# Altium footprint library Ixora.PcbLib: 199 footprints (part 8 of 13)
Each footprint in its own frame and in the unit in brackets; x right, y up, seen from the top. Pads: shape width x height; smd on the part's side, far side on the other; paste and mask are expansions set on the pad; w line width, h text height; cw(c..) or ccw(c..) is an arc to the next point about the centre after c.
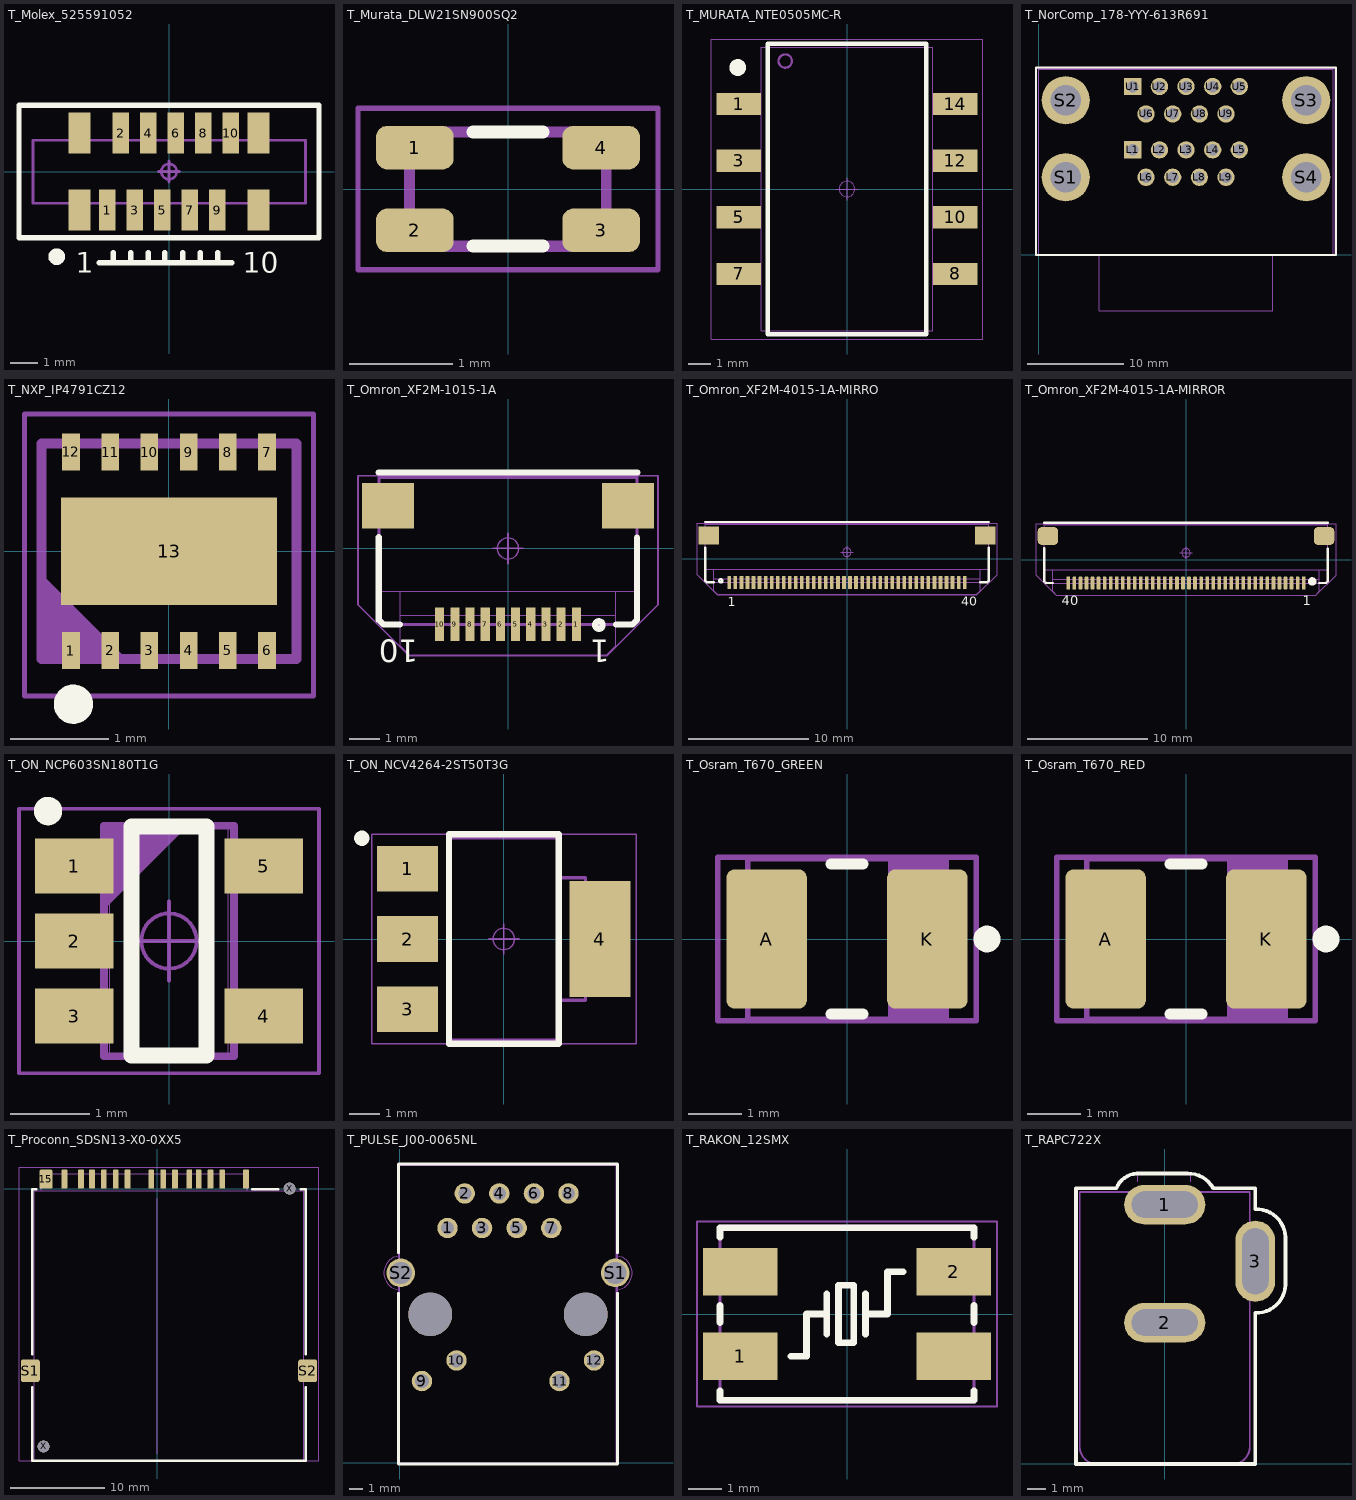
[diagram p7: the footprints below, top view; thin cyan lines are the x and y axes]

## T_Molex_525591052 [mm] "FFC, 10 pin, vertical,  1 sided contact,"
height 3.9
pads (14):
  rect 0.6x1.5 smd: 1(-2.25,-1.4) 2(-1.75,1.4) 3(-1.25,-1.4) 4(-0.75,1.4) 5(-0.25,-1.4) 6(0.25,1.4) 7(0.75,-1.4) 8(1.25,1.4) 9(1.75,-1.4) 10(2.25,1.4)
  rect 0.8x1.5 smd: ""(-3.25,-1.4) ""(-3.25,1.4) ""(3.25,-1.4) ""(3.25,1.4)
Top Overlay:
  circle w0.3: c-4.089,-3.099 r0.153
  lines w0.2: -2.54,-3.327 2.286,-3.327 ; -2.032,-3.327 -2.032,-2.946 ; -1.397,-3.327 -1.397,-2.946 ; -0.762,-3.327 -0.762,-2.946 ; -0.152,-3.327 -0.152,-2.946 ; 0.508,-3.327 0.508,-2.946 ; 1.143,-3.327 1.143,-2.946 ; 1.778,-3.327 1.778,-2.946 ; -5.461,-2.413 5.461,-2.413 5.461,2.413 -5.461,2.413 -5.461,-2.413
  text "1" at -3.404,-3.681 h0.75
  text "10" at 2.692,-3.681 h0.75
Mechanical 1:
  lines w0.1: -5.461,-2.413 5.461,-2.413 5.461,2.413 -5.461,2.413 -5.461,-2.413
Mechanical 2:
  lines w0.01: -4.95,-1.15 -4.95,1.15 4.95,1.15 4.95,-1.15 -4.95,-1.15
Mechanical 3:
  circle w0.1: c0,0 r0.279
  lines w0.1: -0.381,0 0.381,0 ; 0,-0.381 0,0.381 ; -4.95,-1.15 -4.95,1.143 4.978,1.143 4.978,-1.15 -4.95,-1.15
3D body "525591052.stp": height 5.3, standoff 0, extent -5.35,-1.65 5.35,1.85

## T_Murata_DLW21SN900SQ2 [mm] "Common Mode Choke"
height 1.2
pads (4):
  rrect50% 0.75x0.42 smd: 1(-0.9,0.4) 2(-0.9,-0.4) 3(0.9,-0.4) 4(0.9,0.4)
Top Overlay:
  lines w0.127: -0.34,-0.55 0.34,-0.55 ; -0.34,0.55 0.34,0.55
Mechanical 1:
  lines w0.05: -1.45,-0.78 -1.45,0.78 1.45,0.78 1.45,-0.78 -1.45,-0.78
Mechanical 2:
  lines w0.001: -1,-0.6 -1,0.6 1,0.6 1,-0.6 -1,-0.6
Mechanical 3:
  lines w0.1: -0.95,-0.55 -0.95,0.55 0.95,0.55 0.95,-0.55 -0.95,-0.55
3D body: height 1.2, standoff 0, extent -1,-0.6 1,0.6

## T_MURATA_NTE0505MC-R [mm] "Isolated DC/DC converter"
height 6.6
pads (8):
  rect 2x1 smd: 1(-4.85,3.81) 3(-4.85,1.27) 5(-4.85,-1.27) 7(-4.85,-3.81) 8(4.85,-3.81) 10(4.85,-1.27) 12(4.85,1.27) 14(4.85,3.81)
Top Overlay:
  circle w0.5: c-4.905,5.45 r0.125
  lines w0.2: -3.56,-6.51 -3.56,6.51 3.56,6.51 3.56,-6.51 -3.56,-6.51
Mechanical 1:
  circle w0.05: c0,0 r0.35
  lines w0.05: -0.5,0 0.5,0 ; 0,-0.5 0,0.5 ; -6.08,-6.73 -6.08,6.73 6.08,6.73 6.08,-6.73 -6.08,-6.73
Mechanical 2:
  lines w0.001: -3.85,-6.35 -3.85,6.35 3.85,6.35 3.85,-6.35 -3.85,-6.35
Mechanical 3:
  circle w0.1: c-2.77,5.74 r0.3
  lines w0.1: -3.56,-6.51 3.56,-6.51 3.56,6.51 -3.56,6.51 -3.56,-6.51
3D body: height 6.6, standoff 0, extent -3.85,-6.35 3.85,6.35

## T_NorComp_178-YYY-613R691 [mm] "0.750 Center Dual Port D-Sub - Male over Male"
height 31.75
pads (22):
  rect 1.8x1.8 hole 1.2: L1(9.754,10.922) U1(9.754,17.501)
  round 1.8 hole 1.2: L2(12.522,10.922) L3(15.291,10.922) L4(18.059,10.922) L5(20.828,10.922) L6(11.138,8.077) L7(13.906,8.077) L8(16.675,8.077) L9(19.444,8.077) U2(12.522,17.501) U3(15.291,17.501) U4(18.059,17.501) U5(20.828,17.501) U6(11.138,14.656) U7(13.906,14.656) U8(16.675,14.656) U9(19.444,14.656)
  round 5 hole 3.2: S1(2.794,8.077) S2(2.794,16.078) S3(27.788,16.078) S4(27.788,8.077)
Top Overlay:
  lines w0.2: -0.3,0 30.875,0 30.875,19.5 -0.3,19.5 -0.3,0
Mechanical 1:
  lines w0.05: -0.213,0 30.802,0 30.802,19.417 -0.213,19.417 -0.213,0
Mechanical 2:
  lines w0.001: -0.002,0 30.58,0 ; 0,0 0,19.31 30.582,19.31 30.582,0 ; 6.291,0 6.291,-5.791 24.291,-5.791 24.291,0
Mechanical 3:
  lines w0.1: -0.216,0 30.802,0 30.802,19.413 -0.216,19.413 -0.216,0
3D body "178-009-613.STEP": height 31.79, standoff -3.16, extent -0.114,-6.096 30.696,19.304

## T_NXP_IP4791CZ12 [mm] "HDMI ESD protection, level shifter and backdrive protection- SOT1156-1"
height 0.5
pads (13):
  rect 0.18x0.375 smd: 1(-1,-1.012) 2(-0.6,-1.012) 3(-0.2,-1.012) 4(0.2,-1.012) 5(0.6,-1.012) 6(1,-1.012) 7(1,1.012) 8(0.6,1.012) 9(0.2,1.012) 10(-0.2,1.012) 11(-0.6,1.012) 12(-1,1.012)
  rect 2.2x1.1 smd paste-2: 13(0,0)
Top Overlay:
  circle w0.2: c-0.975,-1.56 r0.1
Top Paste:
  rectangle: -0.4,-0.2 0.4,0.2
Mechanical 1:
  circle w0.05: c0,0 r0.35
  lines w0.05: -0.5,0 0.5,0 ; 0,-0.5 0,0.5 ; -1.475,-1.475 1.475,-1.475 1.475,1.4 -1.475,1.4 -1.475,-1.475
Mechanical 2:
  lines w0.01: -1.3,-1.1 -1.3,1.1 1.3,1.1 1.3,-1.1 -1.3,-1.1
Mechanical 3:
  lines w0.1: -1.3,-1 -1.2,-1.1 ; -1.3,-0.9 -1.1,-1.1 ; -1.3,-0.8 -1,-1.1 ; -1.3,-0.7 -0.9,-1.1 ; -1.3,-0.6 -0.8,-1.1 ; -1.3,-0.5 -0.7,-1.1 ; -1.3,-0.4 -0.6,-1.1 ; -1.3,-0.3 -0.5,-1.1 ; -1.3,-1.1 -1.3,1.1 1.3,1.1 1.3,-1.1 -1.3,-1.1
3D body: height 0.5, standoff 0, extent -1.3,-1.1 1.3,1.1

## T_Omron_XF2M-1015-1A [mm] "FFC Connector, Rotart Lock, Top Bottom Contact 0.5mm pitch"
height 2
pads (12):
  rect 0.3x1.1 smd: 1(2.25,-2.5) 2(1.75,-2.5) 3(1.25,-2.5) 4(0.75,-2.5) 5(0.25,-2.5) 6(-0.25,-2.5) 7(-0.75,-2.5) 8(-1.25,-2.5) 9(-1.75,-2.5) 10(-2.25,-2.5)
  rect 1.7x1.5 smd: ""(-3.95,1.4) ""(3.95,1.4)
Top Overlay:
  circle w0.2: c2.991,-2.519 r0.125
  lines w0.2: -4.252,0.369 -4.252,-2.348 -4.1,-2.5 -3.55,-2.5 ; -4.252,2.507 4.252,2.507 ; 3.55,-2.5 4.1,-2.5 4.25,-2.35 4.25,0.367
  text "1" at 3.35,-3 h0.75
  text "10" at -2.95,-3 h0.75
Mechanical 1:
  circle w0.05: c0,0 r0.35
  lines w0.05: -0.5,0 0.5,0 ; 0,-0.5 0,0.5 ; -4.936,-1.853 -3.261,-3.528 3.262,-3.528 4.936,-1.854 4.936,2.4 -4.936,2.4 -4.936,-1.853
Mechanical 2:
  lines w0.001: -4.25,-1.4 4.25,-1.4 ; -3.55,-2.5 -4.1,-2.5 -4.25,-2.35 -4.25,0.9 -4.55,0.9 -4.55,2 -4.25,2 -4.25,2.4 4.25,2.4 4.25,2 4.55,2 4.55,0.9 4.25,0.9 4.25,-2.35 4.1,-2.5 3.55,-2.5 ; -3.55,-2.2 3.55,-2.2 ; -3.55,-1.4 -3.55,-3.2 -3.25,-3.5 ; -3.2,-3.5 3.3,-3.5 ; 3.25,-3.5 3.55,-3.2 3.55,-1.4
Mechanical 3:
  lines w0.1: 4.25,2.334 4.25,-2.35 4.1,-2.5 -4.1,-2.5 -4.252,-2.348 -4.252,2.334 4.252,2.334
3D body "XF2M_1015_1A.step": height 2, standoff 0, extent -4.55,-3.5 4.55,2.4

## T_Omron_XF2M-4015-1A-MIRRO [mm] "DVI FFC Connector 0.5mm pitch"
height 2
pads (42):
  rect 0.3x1.1 smd: 1(-9.75,-1.95) 2(-9.25,-1.95) 3(-8.75,-1.95) 4(-8.25,-1.95) 5(-7.75,-1.95) 6(-7.25,-1.95) 7(-6.75,-1.95) 8(-6.25,-1.95) 9(-5.75,-1.95) 10(-5.25,-1.95) 11(-4.75,-1.95) 12(-4.25,-1.95) 13(-3.75,-1.95) 14(-3.25,-1.95) 15(-2.75,-1.95) 16(-2.25,-1.95) 17(-1.75,-1.95) 18(-1.25,-1.95) 19(-0.75,-1.95) 20(-0.25,-1.95) 21(0.25,-1.95) 22(0.75,-1.95) 23(1.25,-1.95) 24(1.75,-1.95) 25(2.25,-1.95) 26(2.75,-1.95) 27(3.25,-1.95) 28(3.75,-1.95) 29(4.25,-1.95) 30(4.75,-1.95) 31(5.25,-1.95) 32(5.75,-1.95) 33(6.25,-1.95) 34(6.75,-1.95) 35(7.25,-1.95) 36(7.75,-1.95) 37(8.25,-1.95) 38(8.75,-1.95) 39(9.25,-1.95) 40(9.75,-1.95)
  rect 1.7x1.5 smd: ""(-11.45,1.95) ""(11.45,1.95)
Top Overlay:
  circle w0.2: c-10.459,-1.819 r0.125
  lines w0.2: -11.752,0.919 -11.752,-1.798 -11.6,-1.95 -11.05,-1.95 ; -11.752,3.057 11.75,3.057 ; 11.05,-1.95 11.6,-1.95 11.75,-1.8 11.75,0.917
  text "1" at -9.885,-3.908 h0.75
  text "40" at 9.46,-3.899 h0.75
Mechanical 1:
  circle w0.05: c0,0.55 r0.35
  lines w0.05: -0.5,0.55 0.5,0.55 ; 0,0.05 0,1.05 ; -12.436,-1.303 -12.436,2.95 12.436,2.95 12.436,-1.304 10.762,-2.978 -10.761,-2.978 -12.436,-1.303
Mechanical 2:
  lines w0.001: -11.75,-0.85 11.75,-0.85 ; -11.05,-1.95 -11.6,-1.95 -11.75,-1.8 -11.75,1.45 -12.05,1.45 -12.05,2.55 -11.75,2.55 -11.75,2.95 11.75,2.95 11.75,2.55 12.05,2.55 12.05,1.45 11.75,1.45 11.75,-1.8 11.6,-1.95 11.05,-1.95 ; -11.05,-1.65 11.05,-1.65 ; -11.05,-0.85 -11.05,-2.65 -10.75,-2.95 10.75,-2.95 11.05,-2.65 11.05,-0.85
Mechanical 3:
  lines w0.1: -11.752,-1.798 -11.752,2.884 11.75,2.884 11.75,-1.8 11.6,-1.95 -11.6,-1.95 -11.752,-1.798
3D body "xf2m-4015-1a.stp": height 2.02, standoff 0.02, extent -12.05,-2.95 12.05,2.95

## T_Omron_XF2M-4015-1A-MIRROR [mm] "DVI FFC Connector 0.5mm pitch"
height 2
pads (42):
  rrect50% 0.3x1.1 smd: 1(9.75,-1.95) 2(9.25,-1.95) 3(8.75,-1.95) 4(8.25,-1.95) 5(7.75,-1.95) 6(7.25,-1.95) 7(6.75,-1.95) 8(6.25,-1.95) 9(5.75,-1.95) 10(5.25,-1.95) 11(4.75,-1.95) 12(4.25,-1.95) 13(3.75,-1.95) 14(3.25,-1.95) 15(2.75,-1.95) 16(2.25,-1.95) 17(1.75,-1.95) 18(1.25,-1.95) 19(0.75,-1.95) 20(0.25,-1.95) 21(-0.25,-1.95) 22(-0.75,-1.95) 23(-1.25,-1.95) 24(-1.75,-1.95) 25(-2.25,-1.95) 26(-2.75,-1.95) 27(-3.25,-1.95) 28(-3.75,-1.95) 29(-4.25,-1.95) 30(-4.75,-1.95) 31(-5.25,-1.95) 32(-5.75,-1.95) 33(-6.25,-1.95) 34(-6.75,-1.95) 35(-7.25,-1.95) 36(-7.75,-1.95) 37(-8.25,-1.95) 38(-8.75,-1.95) 39(-9.25,-1.95) 40(-9.75,-1.95)
  rrect50% 1.7x1.5 smd: ""(-11.45,1.95) ""(11.45,1.95)
Top Overlay:
  circle w0.5: c10.459,-1.819 r0.1
  lines w0.2: -11.752,0.919 -11.752,-1.798 -11.6,-1.95 -11.05,-1.95 ; -11.752,3.057 11.75,3.057 ; 11.05,-1.95 11.6,-1.95 11.75,-1.8 11.75,0.917
  text "1" at 9.7,-3.8 h0.8
  text "40" at -10.3,-3.8 h0.8
Mechanical 1:
  circle w0.05: c0,0.55 r0.35
  lines w0.05: -0.5,0.55 0.5,0.55 ; 0,0.05 0,1.05 ; -12.436,-1.303 -12.436,2.95 12.436,2.95 12.436,-1.304 10.762,-2.978 -10.761,-2.978 -12.436,-1.303
Mechanical 2:
  lines w0.001: -11.75,-0.85 11.75,-0.85 ; -11.05,-1.95 -11.6,-1.95 -11.75,-1.8 -11.75,1.45 -12.05,1.45 -12.05,2.55 -11.75,2.55 -11.75,2.95 11.75,2.95 11.75,2.55 12.05,2.55 12.05,1.45 11.75,1.45 11.75,-1.8 11.6,-1.95 11.05,-1.95 ; -11.05,-1.65 11.05,-1.65 ; -11.05,-0.85 -11.05,-2.65 -10.75,-2.95 10.75,-2.95 11.05,-2.65 11.05,-0.85
Mechanical 3:
  lines w0.1: -11.752,-1.798 -11.752,2.884 11.75,2.884 11.75,-1.8 11.6,-1.95 -11.6,-1.95 -11.752,-1.798
3D body "xf2m-4015-1a.stp": height 2.02, standoff 0.02, extent -12.05,-2.95 12.05,2.95

## T_ON_NCP603SN180T1G [mm] "SOT 23"
height 1.1
pads (5):
  rect 1x0.7 smd: 1(-1.2,0.95) 2(-1.2,0) 3(-1.2,-0.95) 4(1.2,-0.95) 5(1.2,0.95)
Top Overlay:
  circle w0.2: c-1.533,1.646 r0.08
  lines w0.2: -0.475,-1.45 -0.475,1.45 0.475,1.45 0.475,-1.45 -0.475,-1.45
Mechanical 1:
  circle w0.05: c0,0 r0.35
  lines w0.05: -0.5,0 0.5,0 ; 0,-0.5 0,0.5 ; -1.9,-1.675 -1.9,1.675 1.9,1.675 1.9,-1.675 -1.9,-1.675
Mechanical 2:
  lines w0.001: -0.75,-1.5 -0.75,1.5 0.75,1.5 0.75,-1.5 -0.75,-1.5
Mechanical 3:
  lines w0.1: -0.825,0.46 0.175,1.46 ; -0.825,0.56 0.075,1.46 ; -0.825,0.66 -0.025,1.46 ; -0.825,0.76 -0.125,1.46 ; -0.825,0.86 -0.225,1.46 ; -0.825,0.96 -0.325,1.46 ; -0.825,1.06 -0.425,1.46 ; -0.825,1.16 -0.525,1.46 ; -0.825,1.26 -0.625,1.46 ; -0.825,1.36 -0.725,1.46 ; -0.825,-1.46 -0.825,1.46 0.825,1.46 0.825,-1.46 -0.825,-1.46
3D body: height 1.1, standoff 0, extent -0.75,-1.5 0.75,1.5

## T_ON_NCV4264-2ST50T3G [mm] "SO4"
height 1.8
pads (4):
  rect 2x1.5 smd: 1(-3.15,2.3) 2(-3.15,0) 3(-3.15,-2.3)
  rect 2x3.8 smd: 4(3.15,0)
Top Overlay:
  circle w0.25: c-4.65,3.3 r0.125
  lines w0.2: -1.8,-3.43 1.8,-3.43 1.8,3.43 -1.8,3.43 -1.8,-3.43
Mechanical 1:
  circle w0.05: c0,0 r0.35
  lines w0.05: -0.5,0 0.5,0 ; 0,-0.5 0,0.5 ; -4.33,-3.43 4.33,-3.43 4.33,3.43 -4.33,3.43 -4.33,-3.43
Mechanical 2:
  lines w0.001: -1.85,-3.35 -1.85,3.35 1.85,3.35 1.85,-3.35 -1.85,-3.35
Mechanical 3:
  lines w0.1: 1.79,-2.006 2.68,-2.006 2.68,2.006 1.79,2.006 ; -1.79,-3.302 1.79,-3.302 1.79,3.302 -1.79,3.302 -1.79,-3.302
3D body: height 1.75, standoff 0, extent -1.85,-3.35 1.85,3.35

## T_Osram_T670_GREEN [mm] "LED-Osram-T670"
height 2.1
pads (2):
  rrect20% 1.5x2.6 smd: A(-1.5,0) K(1.5,0)
Top Overlay:
  circle w0.25: c2.613,0 r0.125
  lines w0.2: -0.3,-1.4 0.3,-1.4 ; -0.3,1.4 0.3,1.4
Mechanical 1:
  lines w0.1: -2.413,-1.524 -2.413,1.524 2.413,1.524 2.413,-1.524 -2.413,-1.524
Mechanical 2:
  lines w0.001: -1.85,-1.5 -1.85,1.5 1.85,1.5 1.85,-1.5 -1.85,-1.5
Mechanical 3:
  rectangle: 0.762,-1.5 1.85,1.5
  lines w0.1: -1.85,-1.5 1.85,-1.5 1.85,1.5 -1.85,1.5 -1.85,-1.5
3D body: height 2.1, standoff 0, extent -1.85,-1.5 1.85,1.5

## T_Osram_T670_RED [mm] "LED-Osram-T670"
height 2.1
pads (2):
  rrect20% 1.5x2.6 smd: A(-1.5,0) K(1.5,0)
Top Overlay:
  circle w0.25: c2.613,0 r0.125
  lines w0.2: -0.3,-1.4 0.3,-1.4 ; -0.3,1.4 0.3,1.4
Mechanical 1:
  lines w0.1: -2.413,-1.524 2.413,-1.524 2.413,1.524 -2.413,1.524 -2.413,-1.524
Mechanical 2:
  lines w0.001: -1.85,-1.5 -1.85,1.5 1.85,1.5 1.85,-1.5 -1.85,-1.5
Mechanical 3:
  rectangle: 0.762,-1.5 1.85,1.5
  lines w0.1: -1.85,-1.5 1.85,-1.5 1.85,1.5 -1.85,1.5 -1.85,-1.5
3D body: height 2.1, standoff 0, extent -1.85,-1.5 1.85,1.5

## T_Proconn_SDSN13-X0-0XX5 [mm] "PROCONN_SD,SDIO/MMC,MMC4.0 CARDHOLDER"
height 3.25
pads (19):
  rrect25% 0.6x2 smd: 1(9.38,1) 2(6.88,1) 3(5.63,1) 4(4.38,1) 5(3.4,1) 6(1.88,1) 7(0.63,1) 8(-0.63,1) 9(-3.13,1) 10(-4.38,1) 11(-5.63,1) 12(-6.88,1) 13(-8.05,1) 14(-9.8,1)
  rrect25% 1.4x2 smd: 15(-11.75,1)
  rrect25% 2x2.4 smd: S1(-13.4,-19.25) S2(15.9,-19.25)
  round 1.25 hole 1.25 unplated: X(-12,-27.25) X(14,0)
Top Overlay:
  lines w0.254: -13.2,-21 -13.2,-28.75 15.7,-28.75 15.7,-21 ; -13.2,-17.5 -13.2,-0.05 -12.75,-0.05 ; 10.05,-0.05 12.8,-0.05 ; 15.15,-0.05 15.7,-0.05 15.7,-17.5
Mechanical 1:
  lines w0.05: -14.6,-28.75 -14.6,2.25 17.1,2.25 17.1,-28.75 -14.6,-28.75
Mechanical 2:
  lines w0.01: -13,-20.05 -13.95,-20.05 -13.95,-18.45 -13,-18.45 ; -12.27,-0.25 -12.27,1.55 9.5,1.55 9.5,-0.25 ; 0,-28 0,-1 ; 15.5,-20.05 16.45,-20.05 16.45,-18.45 15.5,-18.45 ; -13,-28.75 -13,-0.25 15.5,-0.25 15.5,-28.75 -13,-28.75
  text "CL CARD" at 2.77,-19 h2
Mechanical 3:
  lines w0.1: -13,-28.75 15.5,-28.75 15.5,-0.25 -13,-0.25 -13,-28.75
3D body: height 3.25, standoff 0, extent -13,-28.75 15.5,-0.25
3D body: height 0.3, standoff 0, extent 15.5,-20.05 16.45,-18.45
3D body: height 0.3, standoff 0, extent -13.95,-20.05 -13,-18.45

## T_PULSE_J00-0065NL [mm] "RJ45 Connector"
height 14.22
pads (16):
  round 1.5 hole 0.95: 1(3.495,17.24) 2(4.765,19.78) 3(6.035,17.24) 4(7.305,19.78) 5(8.575,17.24) 6(9.845,19.78) 7(11.115,17.24) 8(12.385,19.78)
  round 1.5 hole 1.02: 9(1.615,5.99) 10(4.155,7.51) 11(11.725,5.99) 12(14.265,7.51)
  round 2.1 hole 1.63: S1(15.815,13.94) S2(0.065,13.94)
  round 3.2 hole 3.2: ""(2.225,10.89) ""(13.655,10.89)
Top Overlay:
  lines w0.2: -0.102,12.446 -0.102,-0.102 15.983,-0.102 15.983,12.446 ; -0.102,15.418 -0.102,21.942 15.983,21.942 15.983,15.418
Mechanical 1:
  region: 5.81,17.065 5.81,17.415 6.26,17.415 6.26,17.065
  lines w0.05: -0.102,-0.102 -0.102,12.701 cw(c0.064,13.94) -0.101,15.179 -0.102,21.941 15.981,21.941 15.981,15.179 cw(c15.816,13.94) 15.981,12.701 15.981,-0.102 -0.102,-0.102
Mechanical 2:
  lines w0.001: 0,0 15.88,0 15.88,21.84 0,21.84 0,0
Mechanical 3:
  lines w0.1: -0.102,-0.102 15.983,-0.102 15.983,21.941 -0.102,21.941 -0.102,-0.102
3D body "7499010211A.stp": height 13.32, standoff -3.23, extent 0,0 15.88,21.84

## T_RAKON_12SMX [mm] "OSC"
height 1.4
pads (4):
  rect 2.2x1.4 smd: 1(-3.15,-1.25) 2(3.15,1.25) ""(-3.15,1.25) ""(3.15,-1.25)
Top Overlay:
  lines w0.2: -3.75,-2.55 3.75,-2.55 ; -3.75,-2.548 -3.75,-2.269 ; -3.75,-0.25 -3.75,0.25 ; -3.75,2.269 -3.75,2.548 ; -3.75,2.55 3.75,2.55 ; -1.65,-1.25 -1.2,-1.25 ; -0.6,-0.6 -0.6,0.6 ; -0.6,0 -1.2,0 -1.2,-1.25 ; 0.55,-0.6 0.55,0.6 ; 0.55,0 1.2,0 1.2,1.25 1.65,1.25 ; 3.75,-2.548 3.75,-2.269 ; 3.75,-0.25 3.75,0.25 ; 3.75,2.269 3.75,2.548 ; -1.2,-1.25 -1.2,-1.25 ; -0.25,-0.85 0.2,-0.85 0.2,0.85 -0.25,0.85 -0.25,-0.85
Mechanical 1:
  lines w0.05: -4.43,-2.73 -4.43,2.73 4.43,2.73 4.43,-2.73 -4.43,-2.73
Mechanical 2:
  lines w0.001: -3.75,-2.6 -3.75,2.6 3.75,2.6 3.75,-2.6 -3.75,-2.6
Mechanical 3:
  lines w0.1: -3.75,-2.6 -3.75,2.6 3.75,2.6 3.75,-2.6 -3.75,-2.6
3D body: height 1.4, standoff 0, extent -3.75,-2.6 3.75,2.6

## T_RAPC722X [mm] "Connector, 2.1mm (Dia), 5.5mm(Dia), Round Power Socket"
height 10.7
pads (3):
  oval 4.3x2.1 hole 1.4 slot 3.5 at 0 deg: 1(0,13.74) 2(0,7.49)
  oval 2.1x4.3 hole 1.4 slot 3.5 at 90 deg: 3(4.8,10.74)
Top Overlay:
  lines w0.2: 1.196,15.393 -1.3,15.393 ccw(c-1.385,14.115) -2.569,14.6 -4.7,14.6 -4.7,0 4.79,0 4.79,8 ccw(c4.843,9.553) 6.396,9.499 6.396,11.996 ccw(c4.841,11.945) 4.79,13.5 4.79,14.59 4.78,14.6 2.569,14.6 ccw(c1.234,13.866) 1.2,15.388
Mechanical 1:
  lines w0.05: -1.332,15.393 1.164,15.393 ; -1.332,15.394 ccw(c-1.384,14.115) -2.568,14.6 -4.7,14.6 -4.7,0 4.8,0 4.8,8 ccw(c4.843,9.553) 6.396,9.499 6.396,11.996 ccw(c4.841,11.945) 4.8,13.5 4.8,14.6 2.568,14.6 ; 1.169,15.388 cw(c1.203,13.866) 2.537,14.6
Mechanical 2:
  lines w0.001: -1.432,14.95 -1.432,15.4 ; -1.4,13.95 -1.4,14.4 -4.5,14.4 -4.5,0.9 ccw(c-3.6,0.9) -3.6,0 3.6,0 ; 1.368,14.95 1.368,15.4 ; 1.4,13.95 1.4,14.4 4.5,14.4 4.5,0.9 cw(c3.6,0.9) 3.6,0
Mechanical 3:
  lines w0.1: -4.5,0.9 ccw(c-3.6,0.9) -3.6,0 3.6,0 ccw(c3.6,0.9) 4.5,0.9 4.5,14.4 -4.5,14.4 -4.5,0.9
3D body: height 7.4, standoff 5.4, extent -1,0 0.992,2
3D body: height 9.59, standoff 3.21, extent -3.2,0 3.175,2
3D body: height 4, standoff -3.7, extent -1.4,13.55 1.4,13.75
3D body: height 4, standoff -3.7, extent -1.2,7.55 1.2,7.75
3D body: height 4, standoff -3.7, extent 4.5,9.45 4.7,11.85
3D body: height 10.7, standoff 0, extent -4.5,0 4.5,14.4